# Altium footprint library 6-Connectors-5.PcbLib: 46 footprints (part 2 of 5)
Each footprint in its own frame and in the unit in brackets; x right, y up, seen from the top. Pads: shape width x height; smd on the part's side, far side on the other; paste and mask are expansions set on the pad; w line width, h text height; cw(c..) or ccw(c..) is an arc to the next point about the centre after c.
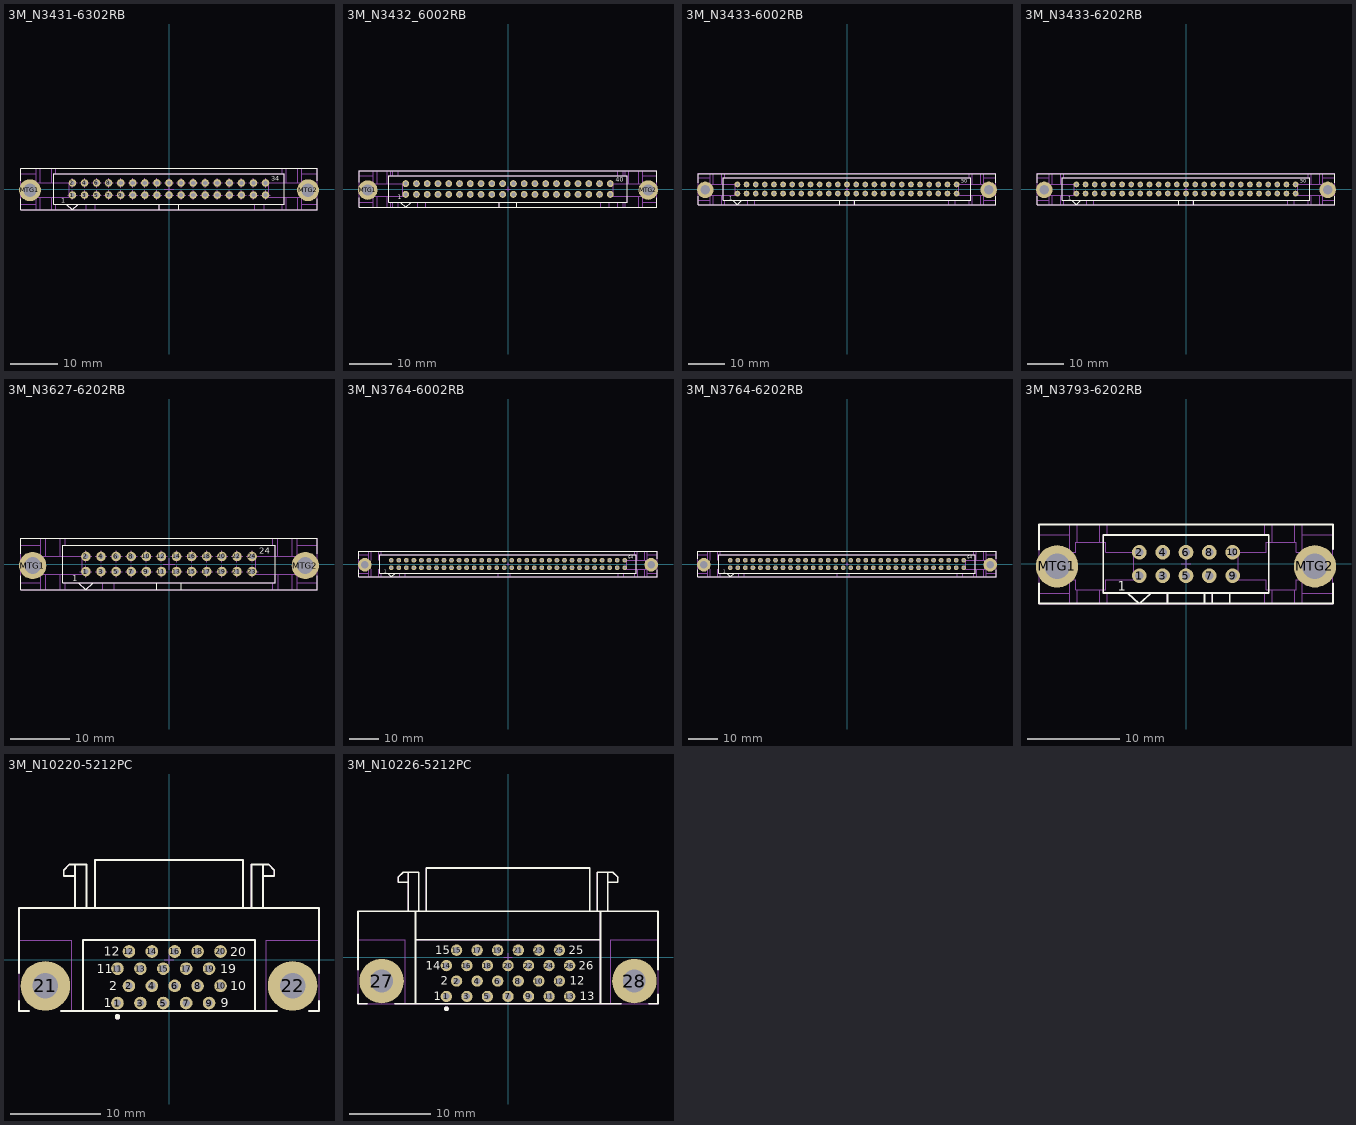
[diagram p1: the footprints below, top view; thin cyan lines are the x and y axes]

## 3M_N3431-6302RB [mm] "3M, 3000 Series, 34 Contacts - Pitch 2.54mm - Straight Four-Wall Header (Black) With Long Roll Pin Latch/Ejectors"
height 27.2
pads (36):
  round 1.6 hole 0.9: 1(-20.32,-1.27) 2(-20.32,1.27) 3(-17.78,-1.27) 4(-17.78,1.27) 5(-15.24,-1.27) 6(-15.24,1.27) 7(-12.7,-1.27) 8(-12.7,1.27) 9(-10.16,-1.27) 10(-10.16,1.27) 11(-7.62,-1.27) 12(-7.62,1.27) 13(-5.08,-1.27) 14(-5.08,1.27) 15(-2.54,-1.27) 16(-2.54,1.27) 17(0,-1.27) 18(0,1.27) 19(2.54,-1.27) 20(2.54,1.27) 21(5.08,-1.27) 22(5.08,1.27) 23(7.62,-1.27) 24(7.62,1.27) 25(10.16,-1.27) 26(10.16,1.27) 27(12.7,-1.27) 28(12.7,1.27) 29(15.24,-1.27) 30(15.24,1.27) 31(17.78,-1.27) 32(17.78,1.27) 33(20.32,-1.27) 34(20.32,1.27)
  round 4.6 hole 2.8: MTG1(-29.274,-0.254) MTG2(29.274,-0.254)
Top Overlay:
  lines w0.2: -31.242,-2 -31.242,-4.318 31.242,-4.318 31.242,-2 ; -31.242,1.7 -31.242,4.3 ; -31.242,4.318 31.242,4.318 ; -2.032,-4.318 -2.032,-3.175 ; 2.032,-4.318 2.032,-3.175 ; 31.242,1.7 31.242,4.3 ; -24.257,-3.175 24.257,-3.175 24.257,3.175 -24.257,3.175 -24.257,-3.175 ; -21.59,-3.175 -20.32,-4.318 -19.05,-3.175 -21.59,-3.175
  text "34" at 21.555,1.727 h1.02
  text "1" at -22.657,-2.921 h1.02
Mechanical 8:
  lines w0.1: -21.32,-1.27 -20.32,-1.27 ; -21.32,1.27 -20.32,1.27 ; -20.32,-2.27 -20.32,-1.27 ; -20.32,-0.27 -20.32,-1.27 ; -20.32,0.27 -20.32,1.27 ; -20.32,2.27 -20.32,1.27 ; -19.32,-1.27 -20.32,-1.27 ; -19.32,1.27 -20.32,1.27 ; -18.78,-1.27 -17.78,-1.27 ; -18.78,1.27 -17.78,1.27 ; -17.78,-2.27 -17.78,-1.27 ; -17.78,-0.27 -17.78,-1.27 ; -17.78,0.27 -17.78,1.27 ; -17.78,2.27 -17.78,1.27 ; -16.78,-1.27 -17.78,-1.27 ; -16.78,1.27 -17.78,1.27 ; -16.24,-1.27 -15.24,-1.27 ; -16.24,1.27 -15.24,1.27 ; -15.24,-2.27 -15.24,-1.27 ; -15.24,-0.27 -15.24,-1.27 ; -15.24,0.27 -15.24,1.27 ; -15.24,2.27 -15.24,1.27 ; -14.24,-1.27 -15.24,-1.27 ; -14.24,1.27 -15.24,1.27 ; -13.7,-1.27 -12.7,-1.27 ; -13.7,1.27 -12.7,1.27 ; -12.7,-2.27 -12.7,-1.27 ; -12.7,-0.27 -12.7,-1.27 ; -12.7,0.27 -12.7,1.27 ; -12.7,2.27 -12.7,1.27 ; -11.7,-1.27 -12.7,-1.27 ; -11.7,1.27 -12.7,1.27 ; -11.16,-1.27 -10.16,-1.27 ; -11.16,1.27 -10.16,1.27 ; -10.16,-2.27 -10.16,-1.27 ; -10.16,-0.27 -10.16,-1.27 ; -10.16,0.27 -10.16,1.27 ; -10.16,2.27 -10.16,1.27 ; -9.16,-1.27 -10.16,-1.27 ; -9.16,1.27 -10.16,1.27 ; -8.62,-1.27 -7.62,-1.27 ; -8.62,1.27 -7.62,1.27 ; -7.62,-2.27 -7.62,-1.27 ; -7.62,-0.27 -7.62,-1.27 ; -7.62,0.27 -7.62,1.27 ; -7.62,2.27 -7.62,1.27 ; -6.62,-1.27 -7.62,-1.27 ; -6.62,1.27 -7.62,1.27 ; -6.08,-1.27 -5.08,-1.27 ; -6.08,1.27 -5.08,1.27 ; -5.08,-2.27 -5.08,-1.27 ; -5.08,-0.27 -5.08,-1.27 ; -5.08,0.27 -5.08,1.27 ; -5.08,2.27 -5.08,1.27 ; -4.08,-1.27 -5.08,-1.27 ; -4.08,1.27 -5.08,1.27 ; -3.54,-1.27 -2.54,-1.27 ; -3.54,1.27 -2.54,1.27 ; -2.54,-2.27 -2.54,-1.27 ; -2.54,-0.27 -2.54,-1.27 ; -2.54,0.27 -2.54,1.27 ; -2.54,2.27 -2.54,1.27 ; -1.54,-1.27 -2.54,-1.27 ; -1.54,1.27 -2.54,1.27 ; -1,-1.27 0,-1.27 ; -1,0 0,0 ; -1,1.27 0,1.27 ; 0,-2.27 0,-1.27 ; 0,-1 0,0 ; 0,-0.27 0,-1.27 ; 0,0.27 0,1.27 ; 0,1 0,0 ; 0,2.27 0,1.27 ; 1,-1.27 0,-1.27 ; 1,0 0,0 ; 1,1.27 0,1.27 ; 1.54,-1.27 2.54,-1.27 ; 1.54,1.27 2.54,1.27 ; 2.54,-2.27 2.54,-1.27 ; 2.54,-0.27 2.54,-1.27 ; 2.54,0.27 2.54,1.27 ; 2.54,2.27 2.54,1.27 ; 3.54,-1.27 2.54,-1.27 ; 3.54,1.27 2.54,1.27 ; 4.08,-1.27 5.08,-1.27 ; 4.08,1.27 5.08,1.27 ; 5.08,-2.27 5.08,-1.27 ; 5.08,-0.27 5.08,-1.27 ; 5.08,0.27 5.08,1.27 ; 5.08,2.27 5.08,1.27 ; 6.08,-1.27 5.08,-1.27 ; 6.08,1.27 5.08,1.27 ; 6.62,-1.27 7.62,-1.27 ; 6.62,1.27 7.62,1.27 ; 7.62,-2.27 7.62,-1.27 ; 7.62,-0.27 7.62,-1.27 ; 7.62,0.27 7.62,1.27 ; 7.62,2.27 7.62,1.27 ; 8.62,-1.27 7.62,-1.27 ; 8.62,1.27 7.62,1.27 ; 9.16,-1.27 10.16,-1.27 ; 9.16,1.27 10.16,1.27 ; 10.16,-2.27 10.16,-1.27 ; 10.16,-0.27 10.16,-1.27 ; 10.16,0.27 10.16,1.27 ; 10.16,2.27 10.16,1.27 ; 11.16,-1.27 10.16,-1.27 ; 11.16,1.27 10.16,1.27 ; 11.7,-1.27 12.7,-1.27 ; 11.7,1.27 12.7,1.27 ; 12.7,-2.27 12.7,-1.27 ; 12.7,-0.27 12.7,-1.27 ; 12.7,0.27 12.7,1.27 ; 12.7,2.27 12.7,1.27 ; 13.7,-1.27 12.7,-1.27 ; 13.7,1.27 12.7,1.27 ; 14.24,-1.27 15.24,-1.27 ; 14.24,1.27 15.24,1.27 ; 15.24,-2.27 15.24,-1.27 ; 15.24,-0.27 15.24,-1.27 ; 15.24,0.27 15.24,1.27 ; 15.24,2.27 15.24,1.27 ; 16.24,-1.27 15.24,-1.27 ; 16.24,1.27 15.24,1.27 ; 16.78,-1.27 17.78,-1.27 ; 16.78,1.27 17.78,1.27 ; 17.78,-2.27 17.78,-1.27 ; 17.78,-0.27 17.78,-1.27 ; 17.78,0.27 17.78,1.27 ; 17.78,2.27 17.78,1.27 ; 18.78,-1.27 17.78,-1.27 ; 18.78,1.27 17.78,1.27 ; 19.32,-1.27 20.32,-1.27 ; 19.32,1.27 20.32,1.27 ; 20.32,-2.27 20.32,-1.27 ; 20.32,-0.27 20.32,-1.27 ; 20.32,0.27 20.32,1.27 ; 20.32,2.27 20.32,1.27 ; 21.32,-1.27 20.32,-1.27 ; 21.32,1.27 20.32,1.27
Mechanical 14:
  circle w0.1: c29.274,-0.254 r1.27
  circle w0.1: c-29.274,-0.254 r1.27
  lines w0.1: -31.242,-3.175 -27.914,-3.175 ; -30.274,-0.254 -29.274,-0.254 ; -29.274,-1.254 -29.274,-0.254 ; -29.274,0.746 -29.274,-0.254 ; -28.274,-0.254 -29.274,-0.254 ; -27.914,-4.318 -27.914,-1.727 -20.955,-1.727 -20.955,1.27 -27.914,1.27 -27.914,4.318 ; -27.072,-4.318 -27.072,-1.727 ; -27.072,1.27 -27.072,4.318 ; -24.639,-4.318 -24.638,-1.727 ; -24.257,-1.727 -24.257,-3.175 24.257,-3.175 24.257,-1.727 ; -24.257,1.27 -24.257,3.175 24.257,3.175 24.257,1.27 ; -17.469,-4.318 -17.469,-3.175 ; -15.551,-4.318 -15.551,-3.175 ; -2.032,-4.318 -2.032,-3.175 ; 2.032,-4.318 2.032,-3.175 ; 18.091,-4.318 18.091,-3.175 ; 20.009,-4.318 20.009,-3.175 ; 23.796,-4.318 23.796,-3.175 ; 23.796,3.175 23.796,4.318 ; 24.638,1.27 24.638,4.318 ; 24.679,-4.318 24.679,-1.727 ; 27.072,-4.318 27.072,-1.727 ; 27.072,1.27 27.072,4.318 ; 27.914,-4.318 27.914,-1.727 20.955,-1.727 20.955,1.27 27.914,1.27 27.914,4.318 ; 27.914,-3.175 31.242,-3.175 ; 27.914,3.175 31.242,3.175 ; 28.274,-0.254 29.274,-0.254 ; 29.274,-1.254 29.274,-0.254 ; 29.274,0.746 29.274,-0.254 ; 30.274,-0.254 29.274,-0.254 ; -31.242,-4.318 31.242,-4.318 31.242,4.318 -31.242,4.318 -31.242,-4.318 ; -31.242,3.175 -27.914,3.175 -31.242,3.175 ; -30.798,-1.134 -30.798,0.626 -29.274,1.506 -27.75,0.626 -27.75,-1.134 -29.274,-2.014 -30.798,-1.134 ; -24.638,1.27 -24.638,4.318 -24.638,1.27 ; -23.796,-4.318 -23.796,-3.175 -23.796,-4.318 ; -23.796,3.175 -23.796,4.318 -23.796,3.175 ; -21.59,-3.175 -20.32,-4.318 -19.05,-3.175 -21.59,-3.175 ; 27.75,-1.134 27.75,0.626 29.274,1.506 30.798,0.626 30.798,-1.134 29.274,-2.014 27.75,-1.134
  text "34" at 21.555,1.727 h1.02
  text "1" at -22.657,-2.921 h1.02
3D body "3M_N3431-6302RB.stp": height 27.18, standoff -3.94, extent -31.242,-4.318 31.242,4.318

## 3M_N3432_6002RB [mm] "3M, 3000 Series, 40 Contacts - Pitch 2.54mm - Straight Four-Wall Header (Black) Without Roll Pin and Latch/Ejectors Installed"
height 17.3
pads (42):
  round 1.6 hole 0.9: 1(-24.13,-1.27) 2(-24.13,1.27) 3(-21.59,-1.27) 4(-21.59,1.27) 5(-19.05,-1.27) 6(-19.05,1.27) 7(-16.51,-1.27) 8(-16.51,1.27) 9(-13.97,-1.27) 10(-13.97,1.27) 11(-11.43,-1.27) 12(-11.43,1.27) 13(-8.89,-1.27) 14(-8.89,1.27) 15(-6.35,-1.27) 16(-6.35,1.27) 17(-3.81,-1.27) 18(-3.81,1.27) 19(-1.27,-1.27) 20(-1.27,1.27) 21(1.27,-1.27) 22(1.27,1.27) 23(3.81,-1.27) 24(3.81,1.27) 25(6.35,-1.27) 26(6.35,1.27) 27(8.89,-1.27) 28(8.89,1.27) 29(11.43,-1.27) 30(11.43,1.27) 31(13.97,-1.27) 32(13.97,1.27) 33(16.51,-1.27) 34(16.51,1.27) 35(19.05,-1.27) 36(19.05,1.27) 37(21.59,-1.27) 38(21.59,1.27) 39(24.13,-1.27) 40(24.13,1.27)
  round 4.6 hole 2.6: MTG1(-33.07,-0.25) MTG2(33.07,-0.25)
Top Overlay:
  lines w0.2: -35.052,-2.102 -35.052,-4.318 35.052,-4.318 35.052,-2.102 ; -35.052,1.594 -35.052,4.318 35.052,4.318 35.052,1.594 ; -2.032,-4.318 -2.032,-3.175 ; 2.032,-4.318 2.032,-3.175 ; -28.067,-3.175 -28.067,3.175 28.067,3.175 28.067,-3.175 -28.067,-3.175 ; -25.4,-3.175 -24.13,-4.318 -22.86,-3.175 -25.4,-3.175
  text "1" at -25.992,-2.446 h1
  text "40" at 25.365,1.727 h1
Mechanical 8:
  drawing of 172 lines, arcs and shapes, not listed
Mechanical 14:
  circle w0.1: c33.084,-0.254 r1.27
  circle w0.1: c-33.084,-0.254 r1.27
  lines w0.1: -35.052,-3.175 -31.724,-3.175 ; -35.052,3.175 -31.724,3.175 ; -31.724,-4.318 -31.724,-1.727 -24.765,-1.727 -24.765,1.27 -31.724,1.27 -31.724,4.318 ; -30.882,-4.318 -30.882,-1.727 ; -30.882,1.27 -30.882,4.318 ; -28.448,-4.318 -28.448,-1.727 ; -28.448,1.27 -28.448,4.318 ; -28.067,-1.727 -28.067,-3.175 28.067,-3.175 28.067,-1.727 ; -28.067,1.27 -28.067,3.175 28.067,3.175 28.067,1.27 ; -27.606,-4.318 -27.606,-3.175 ; -27.606,3.175 -27.606,4.318 ; -27.164,-4.318 -27.164,-3.175 ; -27.164,3.175 -27.164,4.318 ; -25.913,-4.318 -25.913,-3.175 ; -25.913,3.175 -25.913,4.318 ; -21.279,-4.318 -21.279,-3.175 ; -19.361,-4.318 -19.361,-3.175 ; -2.032,-4.318 -2.032,-3.175 ; 2.032,-4.318 2.032,-3.175 ; 21.901,-4.318 21.901,-3.175 ; 23.819,-4.318 23.819,-3.175 ; 25.913,-4.318 25.913,-3.175 ; 25.913,3.175 25.913,4.318 ; 27.164,-4.318 27.164,-3.175 ; 27.164,3.175 27.164,4.318 ; 27.606,-4.318 27.606,-3.175 ; 27.606,3.175 27.606,4.318 ; 28.493,1.27 28.493,4.318 ; 30.882,-4.318 30.882,-1.727 ; 30.882,1.27 30.882,4.318 ; 31.724,-4.318 31.724,-1.727 24.765,-1.727 24.765,1.27 31.724,1.27 31.724,4.318 ; 31.724,-3.175 35.052,-3.175 ; 31.724,3.175 35.052,3.175 ; -35.052,-4.318 -35.052,4.318 35.052,4.318 35.052,-4.318 -35.052,-4.318 ; -34.608,-1.134 -34.608,0.626 -33.084,1.506 -31.56,0.626 -31.56,-1.134 -33.084,-2.014 -34.608,-1.134 ; 31.56,-1.134 31.56,0.626 33.084,1.506 34.608,0.626 34.608,-1.134 33.084,-2.014 31.56,-1.134
  text "1" at -26,-1.2 h1
  text "40" at 25.365,1.727 h1
3D body "3M_N3432_6002RB.stp": height 17.27, standoff -3.94, extent -35.052,-4.318 35.052,4.318

## 3M_N3433-6002RB [mm] "3M, 3000 Series, 50 Contacts - Pitch 2.54mm - Straight Four-Wall Header (Black) Without Latch/Ejectors"
height 17.3
pads (52):
  round 1.6 hole 0.9: 1(-30.48,-1.27) 2(-30.48,1.27) 3(-27.94,-1.27) 4(-27.94,1.27) 5(-25.4,-1.27) 6(-25.4,1.27) 7(-22.86,-1.27) 8(-22.86,1.27) 9(-20.32,-1.27) 10(-20.32,1.27) 11(-17.78,-1.27) 12(-17.78,1.27) 13(-15.24,-1.27) 14(-15.24,1.27) 15(-12.7,-1.27) 16(-12.7,1.27) 17(-10.16,-1.27) 18(-10.16,1.27) 19(-7.62,-1.27) 20(-7.62,1.27) 21(-5.08,-1.27) 22(-5.08,1.27) 23(-2.54,-1.27) 24(-2.54,1.27) 25(0,-1.27) 26(0,1.27) 27(2.54,-1.27) 28(2.54,1.27) 29(5.08,-1.27) 30(5.08,1.27) 31(7.62,-1.27) 32(7.62,1.27) 33(10.16,-1.27) 34(10.16,1.27) 35(12.7,-1.27) 36(12.7,1.27) 37(15.24,-1.27) 38(15.24,1.27) 39(17.78,-1.27) 40(17.78,1.27) 41(20.32,-1.27) 42(20.32,1.27) 43(22.86,-1.27) 44(22.86,1.27) 45(25.4,-1.27) 46(25.4,1.27) 47(27.94,-1.27) 48(27.94,1.27) 49(30.48,-1.27) 50(30.48,1.27)
  round 4.6 hole 2.6: MTG1(-39.42,-0.254) MTG2(39.42,-0.254)
Top Overlay:
  lines w0.2: -41.402,-2 -41.402,-4.318 41.402,-4.318 41.402,-2 ; -41.402,1.7 -41.402,4.3 41.402,4.3 41.402,1.7 ; -1.964,-4.318 -1.964,-3.175 ; 2.1,-4.318 2.1,-3.175 ; -34.417,-3.175 34.417,-3.175 34.417,3.175 -34.417,3.175 -34.417,-3.175 ; -31.75,-3.175 -29.21,-3.175 -30.48,-4.318 -31.75,-3.175
  text "1" at -32.817,-2.921 h1.02
  text "50" at 31.715,1.727 h1.02
Mechanical 8:
  drawing of 212 lines, arcs and shapes, not listed
Mechanical 14:
  circle w0.1: c-39.434,-0.254 r1.27
  circle w0.1: c39.434,-0.254 r1.27
  lines w0.1: -41.402,-3.175 -38.074,-3.175 ; -40.434,-0.254 -39.434,-0.254 ; -39.434,-1.254 -39.434,-0.254 ; -39.434,0.746 -39.434,-0.254 ; -38.434,-0.254 -39.434,-0.254 ; -38.074,-4.318 -38.074,-1.727 -31.115,-1.727 -31.115,1.27 -38.074,1.27 -38.074,4.318 ; -37.232,-4.318 -37.232,-1.727 ; -37.232,1.27 -37.232,4.318 ; -34.799,-4.318 -34.798,-1.727 ; -34.417,-1.727 -34.417,-3.175 ; -34.417,1.27 -34.417,3.175 ; -27.629,-4.318 -27.629,-3.175 ; -25.711,-4.318 -25.711,-3.175 ; -2.032,-4.318 -2.032,-3.175 ; 2.032,-4.318 2.032,-3.175 ; 28.251,-4.318 28.251,-3.175 ; 30.169,-4.318 30.169,-3.175 ; 33.956,-4.318 33.956,-3.175 ; 33.956,3.175 33.956,4.318 ; 34.417,-1.727 34.417,-3.175 ; 34.417,1.27 34.417,3.175 ; 34.798,1.27 34.798,4.318 ; 34.839,-4.318 34.839,-1.727 ; 37.232,-4.318 37.232,-1.727 ; 37.232,1.27 37.232,4.318 ; 38.074,-4.318 38.074,-1.727 31.115,-1.727 31.115,1.27 38.074,1.27 38.074,4.318 ; 38.074,-3.175 41.402,-3.175 ; 38.074,3.175 41.402,3.175 ; 38.434,-0.254 39.434,-0.254 ; 39.434,-1.254 39.434,-0.254 ; 39.434,0.746 39.434,-0.254 ; 40.434,-0.254 39.434,-0.254 ; -41.402,-4.318 -41.402,4.318 ; -41.402,-4.318 -41.402,4.318 ; -41.402,-4.318 41.402,-4.318 41.402,4.318 -41.402,4.318 ; -34.417,-3.175 -34.417,3.175 ; -34.417,-3.175 34.417,-3.175 ; -34.417,3.175 34.417,3.175 ; 34.417,-3.175 34.417,3.175 ; -41.402,3.175 -38.074,3.175 -41.402,3.175 ; -40.958,-1.134 -39.434,-2.014 -37.91,-1.134 -37.91,0.626 -39.434,1.506 -40.958,0.626 -40.958,-1.134 ; -34.798,1.27 -34.798,4.318 -34.798,1.27 ; -33.956,-4.318 -33.956,-3.175 -33.956,-4.318 ; -33.956,3.175 -33.956,4.318 -33.956,3.175 ; 37.91,-1.134 39.434,-2.014 40.958,-1.134 40.958,0.626 39.434,1.506 37.91,0.626 37.91,-1.134
  text "50" at 31.715,1.727 h1.02
  text "1" at -32.817,-2.921 h1.02
3D body "3M_N3433_6002RB.stp": height 17.27, standoff -3.94, extent -41.402,-4.318 41.402,4.318

## 3M_N3433-6202RB [mm] "3M, 3000 Series, 50 Contacts - Pitch 2.54mm - Straight Four-Wall Header (Black) With Short Roll Pin Latch/Ejectors"
height 24.6
pads (52):
  round 1.6 hole 0.9: 1(-30.48,-1.27) 2(-30.48,1.27) 3(-27.94,-1.27) 4(-27.94,1.27) 5(-25.4,-1.27) 6(-25.4,1.27) 7(-22.86,-1.27) 8(-22.86,1.27) 9(-20.32,-1.27) 10(-20.32,1.27) 11(-17.78,-1.27) 12(-17.78,1.27) 13(-15.24,-1.27) 14(-15.24,1.27) 15(-12.7,-1.27) 16(-12.7,1.27) 17(-10.16,-1.27) 18(-10.16,1.27) 19(-7.62,-1.27) 20(-7.62,1.27) 21(-5.08,-1.27) 22(-5.08,1.27) 23(-2.54,-1.27) 24(-2.54,1.27) 25(0,-1.27) 26(0,1.27) 27(2.54,-1.27) 28(2.54,1.27) 29(5.08,-1.27) 30(5.08,1.27) 31(7.62,-1.27) 32(7.62,1.27) 33(10.16,-1.27) 34(10.16,1.27) 35(12.7,-1.27) 36(12.7,1.27) 37(15.24,-1.27) 38(15.24,1.27) 39(17.78,-1.27) 40(17.78,1.27) 41(20.32,-1.27) 42(20.32,1.27) 43(22.86,-1.27) 44(22.86,1.27) 45(25.4,-1.27) 46(25.4,1.27) 47(27.94,-1.27) 48(27.94,1.27) 49(30.48,-1.27) 50(30.48,1.27)
  round 4.6 hole 2.6: MTG1(-39.42,-0.254) MTG2(39.42,-0.254)
Top Overlay:
  lines w0.2: -41.402,-2 -41.402,-4.318 41.402,-4.318 41.402,-2 ; -41.402,1.7 -41.402,4.3 41.402,4.3 41.402,1.7 ; -1.964,-4.318 -1.964,-3.175 ; 2.1,-4.318 2.1,-3.175 ; -34.417,-3.175 34.417,-3.175 34.417,3.175 -34.417,3.175 -34.417,-3.175 ; -31.75,-3.175 -29.21,-3.175 -30.48,-4.318 -31.75,-3.175
  text "1" at -32.817,-2.921 h1.02
  text "50" at 31.715,1.727 h1.02
Mechanical 8:
  drawing of 212 lines, arcs and shapes, not listed
Mechanical 14:
  circle w0.1: c-39.434,-0.254 r1.27
  circle w0.1: c39.434,-0.254 r1.27
  lines w0.1: -41.402,-3.175 -38.074,-3.175 ; -40.434,-0.254 -39.434,-0.254 ; -39.434,-1.254 -39.434,-0.254 ; -39.434,0.746 -39.434,-0.254 ; -38.434,-0.254 -39.434,-0.254 ; -38.074,-4.318 -38.074,-1.727 -31.115,-1.727 -31.115,1.27 -38.074,1.27 -38.074,4.318 ; -37.232,-4.318 -37.232,-1.727 ; -37.232,1.27 -37.232,4.318 ; -34.799,-4.318 -34.798,-1.727 ; -34.417,-1.727 -34.417,-3.175 ; -34.417,1.27 -34.417,3.175 ; -27.629,-4.318 -27.629,-3.175 ; -25.711,-4.318 -25.711,-3.175 ; -2.032,-4.318 -2.032,-3.175 ; 2.032,-4.318 2.032,-3.175 ; 28.251,-4.318 28.251,-3.175 ; 30.169,-4.318 30.169,-3.175 ; 33.956,-4.318 33.956,-3.175 ; 33.956,3.175 33.956,4.318 ; 34.417,-1.727 34.417,-3.175 ; 34.417,1.27 34.417,3.175 ; 34.798,1.27 34.798,4.318 ; 34.839,-4.318 34.839,-1.727 ; 37.232,-4.318 37.232,-1.727 ; 37.232,1.27 37.232,4.318 ; 38.074,-4.318 38.074,-1.727 31.115,-1.727 31.115,1.27 38.074,1.27 38.074,4.318 ; 38.074,-3.175 41.402,-3.175 ; 38.074,3.175 41.402,3.175 ; 38.434,-0.254 39.434,-0.254 ; 39.434,-1.254 39.434,-0.254 ; 39.434,0.746 39.434,-0.254 ; 40.434,-0.254 39.434,-0.254 ; -41.402,-4.318 -41.402,4.318 ; -41.402,-4.318 -41.402,4.318 ; -41.402,-4.318 41.402,-4.318 41.402,4.318 -41.402,4.318 ; -34.417,-3.175 -34.417,3.175 ; -34.417,-3.175 34.417,-3.175 ; -34.417,3.175 34.417,3.175 ; 34.417,-3.175 34.417,3.175 ; -41.402,3.175 -38.074,3.175 -41.402,3.175 ; -40.958,-1.134 -39.434,-2.014 -37.91,-1.134 -37.91,0.626 -39.434,1.506 -40.958,0.626 -40.958,-1.134 ; -34.798,1.27 -34.798,4.318 -34.798,1.27 ; -33.956,-4.318 -33.956,-3.175 -33.956,-4.318 ; -33.956,3.175 -33.956,4.318 -33.956,3.175 ; 37.91,-1.134 39.434,-2.014 40.958,-1.134 40.958,0.626 39.434,1.506 37.91,0.626 37.91,-1.134
  text "50" at 31.715,1.727 h1.02
  text "1" at -32.817,-2.921 h1.02
3D body "3M_N3433_6202RB.stp": height 17.98, standoff -3.94, extent -50.799,-4.318 50.799,4.318

## 3M_N3627-6202RB [mm] "3M, 3000 Series, 24 Contacts - Pitch 2.54mm - Straight Four-Wall Header (Black) With Short Roll Pin Latch/Ejectors"
height 24.6
pads (26):
  round 1.6 hole 0.9: 1(-13.97,-1.27) 2(-13.97,1.27) 3(-11.43,-1.27) 4(-11.43,1.27) 5(-8.89,-1.27) 6(-8.89,1.27) 7(-6.35,-1.27) 8(-6.35,1.27) 9(-3.81,-1.27) 10(-3.81,1.27) 11(-1.27,-1.27) 12(-1.27,1.27) 13(1.27,-1.27) 14(1.27,1.27) 15(3.81,-1.27) 16(3.81,1.27) 17(6.35,-1.27) 18(6.35,1.27) 19(8.89,-1.27) 20(8.89,1.27) 21(11.43,-1.27) 22(11.43,1.27) 23(13.97,-1.27) 24(13.97,1.27)
  round 4.6 hole 2.8: MTG1(-22.924,-0.254) MTG2(22.924,-0.254)
Top Overlay:
  lines w0.2: -24.892,-2 -24.892,-4.318 ; -24.892,1.7 -24.892,4.3 ; -2.032,-4.318 -2.032,-3.175 ; 2.032,-4.318 2.032,-3.175 ; 14.732,-4.318 -24.892,-4.318 ; 14.732,4.318 -24.892,4.318 24.892,4.318 ; 24.892,-2 24.892,-4.318 -24.892,-4.318 ; 24.892,1.7 24.892,4.3 ; -17.907,-3.175 -17.907,3.175 17.907,3.175 17.907,-3.175 -17.907,-3.175 ; -15.24,-3.175 -13.97,-4.318 -12.7,-3.175 -15.24,-3.175
  text "1" at -16.307,-2.921 h1.02
  text "24" at 15.205,1.727 h1.02
Mechanical 8:
  lines w0.1: -14.97,-1.27 -13.97,-1.27 ; -14.97,1.27 -13.97,1.27 ; -13.97,-2.27 -13.97,-1.27 ; -13.97,-0.27 -13.97,-1.27 ; -13.97,0.27 -13.97,1.27 ; -13.97,2.27 -13.97,1.27 ; -12.97,-1.27 -13.97,-1.27 ; -12.97,1.27 -13.97,1.27 ; -12.43,-1.27 -11.43,-1.27 ; -12.43,1.27 -11.43,1.27 ; -11.43,-2.27 -11.43,-1.27 ; -11.43,-0.27 -11.43,-1.27 ; -11.43,0.27 -11.43,1.27 ; -11.43,2.27 -11.43,1.27 ; -10.43,-1.27 -11.43,-1.27 ; -10.43,1.27 -11.43,1.27 ; -9.89,-1.27 -8.89,-1.27 ; -9.89,1.27 -8.89,1.27 ; -8.89,-2.27 -8.89,-1.27 ; -8.89,-0.27 -8.89,-1.27 ; -8.89,0.27 -8.89,1.27 ; -8.89,2.27 -8.89,1.27 ; -7.89,-1.27 -8.89,-1.27 ; -7.89,1.27 -8.89,1.27 ; -7.35,-1.27 -6.35,-1.27 ; -7.35,1.27 -6.35,1.27 ; -6.35,-2.27 -6.35,-1.27 ; -6.35,-0.27 -6.35,-1.27 ; -6.35,0.27 -6.35,1.27 ; -6.35,2.27 -6.35,1.27 ; -5.35,-1.27 -6.35,-1.27 ; -5.35,1.27 -6.35,1.27 ; -4.81,-1.27 -3.81,-1.27 ; -4.81,1.27 -3.81,1.27 ; -3.81,-2.27 -3.81,-1.27 ; -3.81,-0.27 -3.81,-1.27 ; -3.81,0.27 -3.81,1.27 ; -3.81,2.27 -3.81,1.27 ; -2.81,-1.27 -3.81,-1.27 ; -2.81,1.27 -3.81,1.27 ; -2.27,-1.27 -1.27,-1.27 ; -2.27,1.27 -1.27,1.27 ; -1.27,-2.27 -1.27,-1.27 ; -1.27,-0.27 -1.27,-1.27 ; -1.27,0.27 -1.27,1.27 ; -1.27,2.27 -1.27,1.27 ; -1,0 0,0 ; -0.27,-1.27 -1.27,-1.27 ; -0.27,1.27 -1.27,1.27 ; 0,-1 0,0 ; 0,1 0,0 ; 0.27,-1.27 1.27,-1.27 ; 0.27,1.27 1.27,1.27 ; 1,0 0,0 ; 1.27,-2.27 1.27,-1.27 ; 1.27,-0.27 1.27,-1.27 ; 1.27,0.27 1.27,1.27 ; 1.27,2.27 1.27,1.27 ; 2.27,-1.27 1.27,-1.27 ; 2.27,1.27 1.27,1.27 ; 2.81,-1.27 3.81,-1.27 ; 2.81,1.27 3.81,1.27 ; 3.81,-2.27 3.81,-1.27 ; 3.81,-0.27 3.81,-1.27 ; 3.81,0.27 3.81,1.27 ; 3.81,2.27 3.81,1.27 ; 4.81,-1.27 3.81,-1.27 ; 4.81,1.27 3.81,1.27 ; 5.35,-1.27 6.35,-1.27 ; 5.35,1.27 6.35,1.27 ; 6.35,-2.27 6.35,-1.27 ; 6.35,-0.27 6.35,-1.27 ; 6.35,0.27 6.35,1.27 ; 6.35,2.27 6.35,1.27 ; 7.35,-1.27 6.35,-1.27 ; 7.35,1.27 6.35,1.27 ; 7.89,-1.27 8.89,-1.27 ; 7.89,1.265 8.89,1.265 ; 8.89,-2.27 8.89,-1.27 ; 8.89,-0.27 8.89,-1.27 ; 8.89,0.27 8.89,1.27 ; 8.89,2.27 8.89,1.27 ; 9.89,-1.27 8.89,-1.27 ; 9.89,1.27 8.89,1.27 ; 10.43,-1.27 11.43,-1.27 ; 10.43,1.27 11.43,1.27 ; 11.43,-2.27 11.43,-1.27 ; 11.43,-0.27 11.43,-1.27 ; 11.43,0.27 11.43,1.27 ; 11.43,2.27 11.43,1.27 ; 12.43,-1.27 11.43,-1.27 ; 12.43,1.27 11.43,1.27 ; 12.97,-1.27 13.97,-1.27 ; 12.97,1.265 13.97,1.265 ; 13.97,-2.27 13.97,-1.27 ; 13.97,-0.27 13.97,-1.27 ; 13.97,0.27 13.97,1.27 ; 13.97,2.27 13.97,1.27 ; 14.97,-1.27 13.97,-1.27 ; 14.97,1.27 13.97,1.27
Mechanical 14:
  circle w0.1: c-22.924,-0.254 r1.27
  circle w0.1: c22.924,-0.254 r1.27
  lines w0.1: -24.892,-3.175 -21.564,-3.175 ; -23.924,-0.254 -22.924,-0.254 ; -22.924,-1.254 -22.924,-0.254 ; -22.924,0.746 -22.924,-0.254 ; -21.924,-0.254 -22.924,-0.254 ; -21.564,-4.318 -21.564,-1.727 -14.605,-1.727 -14.605,1.27 -21.564,1.27 -21.564,4.318 ; -20.722,-4.318 -20.722,-1.727 ; -20.722,1.27 -20.722,4.318 ; -18.289,-4.318 -18.288,-1.727 ; -17.907,-1.727 -17.907,-3.175 17.907,-3.175 17.907,-1.727 ; -17.907,1.27 -17.907,3.175 17.907,3.175 17.907,1.27 ; -11.119,-4.318 -11.119,-3.175 ; -9.201,-4.318 -9.201,-3.175 ; 17.446,-4.318 17.446,-3.175 ; 17.446,3.175 17.446,4.318 ; 18.288,1.27 18.288,4.318 ; 18.329,-4.318 18.329,-1.727 ; 20.722,-4.318 20.722,-1.727 ; 20.722,1.27 20.722,4.318 ; 21.564,-4.318 21.564,-1.727 14.605,-1.727 14.605,1.27 21.564,1.27 21.564,4.318 ; 21.564,-3.175 24.892,-3.175 ; 21.564,3.175 24.892,3.175 ; 21.924,-0.254 22.924,-0.254 ; 22.924,-1.254 22.924,-0.254 ; 22.924,0.746 22.924,-0.254 ; 23.924,-0.254 22.924,-0.254 ; -24.892,-4.318 24.892,-4.318 24.892,4.318 -24.892,4.318 -24.892,-4.318 ; -24.892,3.175 -21.564,3.175 -24.892,3.175 ; -24.448,-1.134 -24.448,0.626 -22.924,1.506 -21.4,0.626 -21.4,-1.134 -22.924,-2.014 -24.448,-1.134 ; -18.288,1.27 -18.288,4.318 -18.288,1.27 ; -17.446,-4.318 -17.446,-3.175 -17.446,-4.318 ; -17.446,3.175 -17.446,4.318 -17.446,3.175 ; -15.24,-3.175 -13.97,-4.318 -12.7,-3.175 -15.24,-3.175 ; 21.4,-1.134 21.4,0.626 22.924,1.506 24.448,0.626 24.448,-1.134 22.924,-2.014 21.4,-1.134
  text "1" at -16.307,-2.921 h1.02
  text "24" at 15.205,1.727 h1.02
3D body "3M_3627-6202RB.stp": height 24.64, standoff -3.94, extent -24.892,-4.318 24.892,4.318